# Altium footprint library SparkFun-Retired.PCBLIB: 302 footprints (part 5 of 19)
Each footprint in its own frame and in the unit in brackets; x right, y up, seen from the top. Pads: shape width x height; smd on the part's side, far side on the other; paste and mask are expansions set on the pad; w line width, h text height; cw(c..) or ccw(c..) is an arc to the next point about the centre after c.
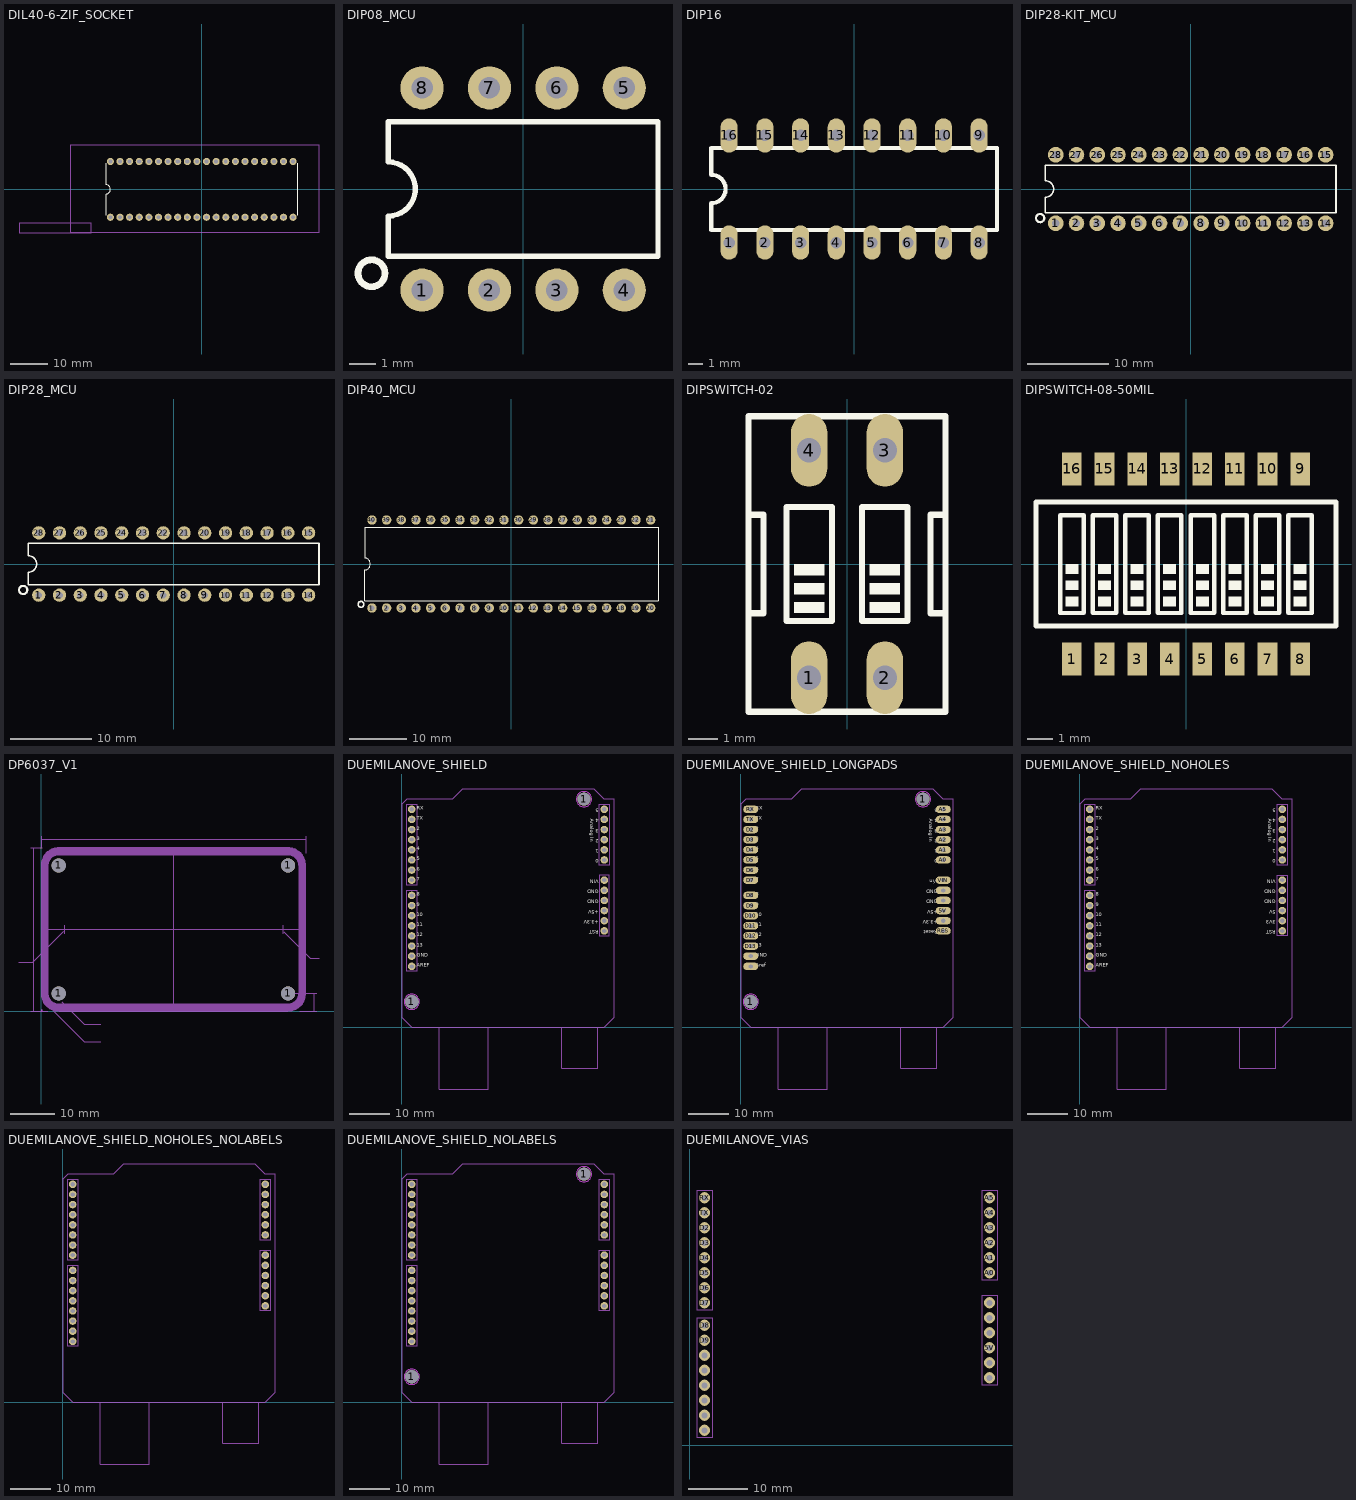
[diagram p4: the footprints below, top view; thin cyan lines are the x and y axes]

## DIL40-6-ZIF_SOCKET [mil]
pads (40):
  round 74 hole 40: 1(-950,-290) 2(-850,-290) 3(-750,-290) 4(-650,-290) 5(-550,-290) 6(-450,-290) 7(-350,-290) 8(-250,-290) 9(-150,-290) 10(-50,-290) 11(50,-290) 12(150,-290) 13(250,-290) 14(350,-290) 15(450,-290) 16(550,-290) 17(650,-290) 18(750,-290) 19(850,-290) 20(950,-290) 21(950,290) 22(850,290) 23(750,290) 24(650,290) 25(550,290) 26(450,290) 27(350,290) 28(250,290)
  round 74 hole 43.31: 29(150,290) 30(50,290) 31(-50,290) 32(-150,290) 33(-250,290) 34(-350,290) 35(-450,290) 36(-550,290) 37(-650,290) 38(-750,290) 39(-850,290) 40(-950,290)
Top Overlay:
  lines w8: -1000,-270 -1000,-50 ccw(c-1000,0) -1000,50 -1000,270 ; 1000,-270 1000,270
Mechanical 16:
  lines w10: -1900,-450 -1900,-350 -1150,-350 -1150,-450 -1900,-450 ; -1368.58,-448.07 1219.21,-448.07 1219.21,457.44 -1368.58,457.44 -1368.58,-448.07

## DIP08_MCU [mil]
pads (8):
  round 64 hole 32: 1(-150,-150) 2(-50,-150) 3(50,-150) 4(150,-150) 5(150,150) 6(50,150) 7(-50,150) 8(-150,150)
Top Overlay:
  circle w10: c-225,-125 r20
  lines w8: -200,-100 200,-100 200,100 -200,100 -200,40 cw(c-200,0) -200,-40 -200,-100

## DIP16 [mil]
pads (16):
  oval 48x96 hole 32: 1(-350,-150) 2(-250,-150) 3(-150,-150) 4(-50,-150) 5(50,-150) 6(150,-150) 7(250,-150) 8(350,-150) 9(350,150) 10(250,150) 11(150,150) 12(50,150) 13(-50,150) 14(-150,150) 15(-250,150) 16(-350,150)
Top Overlay:
  lines w12: -400,-115 400,-115 400,115 -400,115 -400,40 cw(c-400,0) -400,-40 -400,-115

## DIP28-KIT_MCU [mil]
pads (28):
  round 75 hole 34: 1(-650,-165) 2(-550,-165) 3(-450,-165) 4(-350,-165) 5(-250,-165) 6(-150,-165) 7(-50,-165) 8(50,-165) 9(150,-165) 10(250,-165) 11(350,-165) 12(450,-165) 13(550,-165) 14(650,-165) 15(650,165) 16(550,165) 17(450,165) 18(350,165) 19(250,165) 20(150,165) 21(50,165) 22(-50,165) 23(-150,165) 24(-250,165) 25(-350,165) 26(-450,165) 27(-550,165) 28(-650,165)
Top Overlay:
  circle w10: c-725,-140 r20
  lines w8: -700,-115 700,-115 700,115 -700,115 -700,40 cw(c-700,0) -700,-40 -700,-115
Top Solder:
  circle w0: c-650,165 r17
  circle w0: c-550,165 r17
  circle w0: c-450,165 r17
  circle w0: c-350,165 r17
  circle w0: c-650,-165 r17
  circle w0: c-550,-165 r17
  circle w0: c-450,-165 r17
  circle w0: c-350,-165 r17
  circle w0: c-250,165 r17
  circle w0: c-150,165 r17
  circle w0: c-50,165 r17
  circle w0: c50,165 r17
  circle w0: c-250,-165 r17
  circle w0: c-150,-165 r17
  circle w0: c-50,-165 r17
  circle w0: c50,-165 r17
  circle w0: c150,165 r17
  circle w0: c250,165 r17
  circle w0: c350,165 r17
  circle w0: c450,165 r17
  circle w0: c150,-165 r17
  circle w0: c250,-165 r17
  circle w0: c350,-165 r17
  circle w0: c450,-165 r17
  circle w0: c550,165 r17
  circle w0: c650,165 r17
  circle w0: c550,-165 r17
  circle w0: c650,-165 r17
Bottom Solder:
  circle w0: c-650,165 r42
  circle w0: c-550,165 r42
  circle w0: c-450,165 r42
  circle w0: c-350,165 r42
  circle w0: c-650,-165 r42
  circle w0: c-550,-165 r42
  circle w0: c-450,-165 r42
  circle w0: c-350,-165 r42
  circle w0: c-250,165 r42
  circle w0: c-150,165 r42
  circle w0: c-50,165 r42
  circle w0: c50,165 r42
  circle w0: c-250,-165 r42
  circle w0: c-150,-165 r42
  circle w0: c-50,-165 r42
  circle w0: c50,-165 r42
  circle w0: c150,165 r42
  circle w0: c250,165 r42
  circle w0: c350,165 r42
  circle w0: c450,165 r42
  circle w0: c150,-165 r42
  circle w0: c250,-165 r42
  circle w0: c350,-165 r42
  circle w0: c450,-165 r42
  circle w0: c550,165 r42
  circle w0: c650,165 r42
  circle w0: c550,-165 r42
  circle w0: c650,-165 r42

## DIP28_MCU [mil]
pads (28):
  round 64 hole 32: 1(-650,-150) 2(-550,-150) 3(-450,-150) 4(-350,-150) 5(-250,-150) 6(-150,-150) 7(-50,-150) 8(50,-150) 9(150,-150) 10(250,-150) 11(350,-150) 12(450,-150) 13(550,-150) 14(650,-150) 15(650,150) 16(550,150) 17(450,150) 18(350,150) 19(250,150) 20(150,150) 21(50,150) 22(-50,150) 23(-150,150) 24(-250,150) 25(-350,150) 26(-450,150) 27(-550,150) 28(-650,150)
Top Overlay:
  circle w10: c-725,-125 r20
  lines w8: -700,-100 700,-100 700,100 -700,100 -700,40 cw(c-700,0) -700,-40 -700,-100

## DIP40_MCU [mil]
pads (40):
  round 64 hole 32: 1(-950,-300) 2(-850,-300) 3(-750,-300) 4(-650,-300) 5(-550,-300) 6(-450,-300) 7(-350,-300) 8(-250,-300) 9(-150,-300) 10(-50,-300) 11(50,-300) 12(150,-300) 13(250,-300) 14(350,-300) 15(450,-300) 16(550,-300) 17(650,-300) 18(750,-300) 19(850,-300) 20(950,-300) 21(950,300) 22(850,300) 23(750,300) 24(650,300) 25(550,300) 26(450,300) 27(350,300) 28(250,300) 29(150,300) 30(50,300) 31(-50,300) 32(-150,300) 33(-250,300) 34(-350,300) 35(-450,300) 36(-550,300) 37(-650,300) 38(-750,300) 39(-850,300) 40(-950,300)
Top Overlay:
  circle w10: c-1025,-275 r20
  lines w8: -1000,-250 -1000,-40 ccw(c-1000,0) -1000,40 -1000,250 1000,250 1000,-250 -1000,-250

## DIPSWITCH-02 [mil]
pads (4):
  oval 48x96 hole 32: 1(-50,-150) 2(50,-150) 3(50,150) 4(-50,150)
Top Overlay:
  rectangle: 30,-15 70,0
  rectangle: 30,-40 70,-25
  rectangle: 30,-65 70,-50
  rectangle: -70,-15 -30,0
  rectangle: -70,-40 -30,-25
  rectangle: -70,-65 -30,-50
  lines w8: -130,-65 -110,-65 -110,65 -130,65 ; -130,-65 -130,-195 130,-195 130,-65 ; -130,-65 -130,65 ; -130,65 -130,195 130,195 130,65 ; 130,-65 110,-65 110,65 130,65 ; 130,-65 130,65 ; -80,-75 -80,75 -20,75 -20,-75 -80,-75 ; 20,-75 20,75 80,75 80,-75 20,-75
Mechanical 16:
  text "1" at -60,-165 h93
  text "ON" at -100,100 h93
  text "2" at 30,-165 h93

## DIPSWITCH-08-50MIL [mil]
pads (16):
  rect 30x50 smd: 1(-175,-145.67) 2(-125,-145.67) 3(-75,-145.67) 4(-25,-145.67) 5(25,-145.67) 6(75,-145.67) 7(125,-145.67) 8(175,-145.67) 9(175,145.67) 10(125,145.67) 11(75,145.67) 12(25,145.67) 13(-25,145.67) 14(-75,145.67) 15(-125,145.67) 16(-175,145.67)
Top Overlay:
  rectangle: -185,-15 -165,0
  rectangle: -185,-40 -165,-25
  rectangle: -185,-65 -165,-50
  rectangle: -135,-15 -115,0
  rectangle: -135,-40 -115,-25
  rectangle: -135,-65 -115,-50
  rectangle: -85,-15 -65,0
  rectangle: -85,-40 -65,-25
  rectangle: -85,-65 -65,-50
  rectangle: -35,-15 -15,0
  rectangle: -35,-40 -15,-25
  rectangle: -35,-65 -15,-50
  rectangle: 15,-15 35,0
  rectangle: 15,-40 35,-25
  rectangle: 15,-65 35,-50
  rectangle: 65,-15 85,0
  rectangle: 65,-40 85,-25
  rectangle: 65,-65 85,-50
  rectangle: 115,-15 135,0
  rectangle: 115,-40 135,-25
  rectangle: 115,-65 135,-50
  rectangle: 165,-15 185,0
  rectangle: 165,-40 185,-25
  rectangle: 165,-65 185,-50
  lines w6: -193,-75 -157,-75 ; -143,-75 -107,-75 ; -93,-75 -57,-75 ; -43,-75 -7,-75 ; 7,-75 43,-75 ; 57,-75 93,-75 ; 107,-75 143,-75 ; 157,-75 193,-75
  lines w7: -193,-75 -193,75 -157,75 -157,-75 ; -143,-75 -143,75 -107,75 -107,-75 ; -93,-75 -93,75 -57,75 -57,-75 ; -43,-75 -43,75 -7,75 -7,-75 ; 7,-75 7,75 43,75 43,-75 ; 57,-75 57,75 93,75 93,-75 ; 107,-75 107,75 143,75 143,-75 ; 157,-75 157,75 193,75 193,-75
  lines w8: -230,-95 230,-95 230,-65 230,65 230,95 -230,95 -230,65 -230,-65 -230,-95
Mechanical 16:
  text "1" at -190,-165 h62
  text "ON" at -225,50 h49.6
  text "2" at -140,-165 h62
  text "3" at -90,-165 h62
  text "4" at -40,-165 h62
  text "5" at 10,-165 h62
  text "6" at 60,-165 h62
  text "7" at 110,-165 h62
  text "8" at 160,-165 h62

## DP6037_V1 [mm]
pads (4):
  round 3.2 hole 3.2: 1(4,4) 1(4,33) 1(56,4) 1(56,33)
Bottom Overlay:
  text "DP6037_v1" at 52.5,0.5 h1.08
Mechanical 1:
  lines w0: 0,4 ccw(c4,4) 4,0 ; 0,33 cw(c4,33) 4,37 ; 56,0 ccw(c56,4) 60,4 ; 56,37 cw(c56,33) 60,33
  lines w0.203: 0,4 0,33 cw(c4,33) 4,37 56,37 cw(c56,33) 60,33 60,4 cw(c56,4) 56,0 4,0 cw(c4,4) 0,4
Mechanical 8 keep-out:
  region: 0,0 0.254,0 0.254,0.254 0,0.254
  region: 0,0 0.254,0 0.254,0.254 0,0.254
  region: 0,0 0.254,0 0.254,0.254 0,0.254
  region: 0,0 0.254,0 0.254,0.254 0,0.254
Mechanical 9 keep-out:
  region: 0,0 0.254,0 0.254,0.254 0,0.254
  region: 0,0 0.254,0 0.254,0.254 0,0.254
  region: 0,0 0.254,0 0.254,0.254 0,0.254
  region: 0,0 0.254,0 0.254,0.254 0,0.254
Mechanical 10:
  region: 0,0 0.254,0 0.254,0.254 0,0.254
  region: 0,0 0.254,0 0.254,0.254 0,0.254
  region: 0,0 0.254,0 0.254,0.254 0,0.254
  region: 0,0 0.254,0 0.254,0.254 0,0.254
Mechanical 12:
  lines w0.127: -2.305,0 -1.67,0 ; -2.305,37 -1.67,37 ; 0,37.065 0,38.97 ; 0,39.605 0,38.97 ; 0.235,37 -1.67,37 ; 1.505,0 -1.67,0 ; 2.68,0.14 9.76,-6.94 13.57,-6.94 ; 4.68,2.14 9.76,-2.94 13.57,-2.94 ; 56,4 61.83,4 ; 58.655,0 61.83,0 ; 60,35.795 60,38.97 ; 60,39.605 60,38.97 ; 62.465,0 61.83,0 ; 62.465,4 61.83,4 ; -1.67,0 -1.67,37 ; 0,38.97 60,38.97 ; 61.83,0 61.83,4
  text "60mm" at 28.81,38.97 h2.16
  text "37mm" at -1.67,14.205 h2.16
  text "D = 3.2mm" at 13.57,-3.575 h2.16
  text "4.0mm" at 65.64,-1.035 h2.16
  text "R = 4.0mm" at 13.57,-7.575 h2.16
  text "60mm" at 28.81,38.97 h2.16
  text "37mm" at -1.67,14.205 h2.16
  text "D = 3.2mm" at 13.57,-3.575 h2.16
  text "4.0mm" at 65.64,-1.035 h2.16
  text "R = 4.0mm" at 13.57,-7.575 h2.16
Mechanical 14:
  lines w0: -5,11 -2,11 5,18 ; 0,18.5 60,18.5 ; 5.25,17.5 5.25,19.5 ; 30,0 30,37 ; 54.75,17.5 54.75,19.5 ; 55,18 61,12 63,12
  text "CENTER" at -10.38,11 h0.86
  text "CENTER" at -10.38,11 h0.86
  text "CENTER" at 63,12 h0.86
Mechanical 27:
  lines w1.7: 0.85,4 0.85,33 cw(c4,33) 4,36.15 56,36.15 cw(c56,33) 59.15,33 59.15,4 cw(c56,4) 56,0.85 4,0.85 cw(c4,4) 0.85,4
Mechanical 28:
  lines w1.7: 0.85,4 0.85,33 cw(c4,33) 4,36.15 56,36.15 cw(c56,33) 59.15,33 59.15,4 cw(c56,4) 56,0.85 4,0.85 cw(c4,4) 0.85,4

## DUEMILANOVE_SHIELD [mil]
pads (30):
  round 130 hole 130: 1(100,250) 1(1800,2250)
  round 74 hole 40: 3.3V(2000,1050) 5V(2000,1150) A0(2000,1650) A1(2000,1750) A2(2000,1850) A3(2000,1950) A4(2000,2050) A5(2000,2150) AREF(100,600) D2(100,1950) D3(100,1850) D4(100,1750) D5(100,1650) D6(100,1550) D7(100,1450) D8(100,1300) D9(100,1200) D10(100,1100) D11(100,1000) D12(100,900) D13(100,800) GND@0(2000,1250) GND@1(2000,1350) GND@2(100,700) RES(2000,950) RX(100,2150) TX(100,2050) VIN(2000,1450)
Top Overlay:
  text "GND" at 1945.5,1270 h62
  text "GND" at 1945.5,1370 h62
  text "+5V" at 1945.5,1170 h62
  text "RST" at 1945.5,970 h62
  text "VIN" at 1945.5,1470 h62
  text "+3.3V" at 1945.5,1070 h62
  text "0" at 1945.5,1670 h62
  text "1" at 1945.5,1770 h62
  text "2" at 1945.5,1870 h62
  text "3" at 1945.5,1970 h62
  text "4" at 1945.5,2070 h62
  text "5" at 1945.5,2170 h62
  text "Analog In" at 1845.5,2055 h62
  text "GND" at 150,680 h62
  text "13" at 150,780 h62
  text "12" at 150,880 h62
  text "11" at 150,980 h62
  text "AREF" at 150,580 h62
  text "10" at 150,1080 h62
  text "9" at 150,1180 h62
  text "8" at 150,1280 h62
  text "7" at 150,1430 h62
  text "6" at 150,1530 h62
  text "5" at 150,1630 h62
  text "4" at 150,1730 h62
  text "3" at 150,1830 h62
  text "2" at 150,1930 h62
  text "TX" at 150,2030 h62
  text "RX" at 150,2130 h62
Mechanical 8 keep-out:
  circle w5: c100,250 r75
  circle w5: c1800,2250 r75
Mechanical 9 keep-out:
  circle w5: c100,250 r75
  circle w5: c1800,2250 r75
Mechanical 16:
  lines w5: 50,550 150,550 150,1350 50,1350 50,550 ; 50,1400 150,1400 150,2200 50,2200 50,1400 ; 1950,900 2050,900 2050,1500 1950,1500 1950,900 ; 1950,1600 2050,1600 2050,2200 1950,2200 1950,1600
  lines w10: 1582.68,-3.94 1582.68,-405.51 1937.01,-405.51 1937.01,-3.94 ; 374.02,0 100,0 0,100 0,2200 50,2250 500,2250 600,2350 1900,2350 2000,2250 2100,2250 2100,100 2000,0 854.33,0 ; 374.02,0 854.33,0 ; 374.02,0 374.02,-610.24 854.33,-610.24 854.33,0

## DUEMILANOVE_SHIELD_LONGPADS [mil]
pads (30):
  round 130 hole 130: 1(100,250) 1(1800,2250)
  oval 148x74 hole 40: 3.3V(2000,1050) 5V(2000,1150) A0(2000,1650) A1(2000,1750) A2(2000,1850) A3(2000,1950) A4(2000,2050) A5(2000,2150) AREF(100,600) D2(100,1950) D3(100,1850) D4(100,1750) D5(100,1650) D6(100,1550) D7(100,1450) D8(100,1300) D9(100,1200) D10(100,1100) D11(100,1000) D12(100,900) D13(100,800) GND@0(2000,1250) GND@1(2000,1350) GND@2(100,700) RES(2000,950) RX(100,2150) TX(100,2050) VIN(2000,1450)
Top Overlay:
  text "GND" at 1945.5,1270 h62
  text "GND" at 1945.5,1370 h62
  text "+5V" at 1945.5,1170 h62
  text "Reset" at 1945.5,970 h62
  text "Vin" at 1945.5,1470 h62
  text "+3.3V" at 1945.5,1070 h62
  text "0" at 1945.5,1670 h62
  text "1" at 1945.5,1770 h62
  text "2" at 1945.5,1870 h62
  text "3" at 1945.5,1970 h62
  text "4" at 1945.5,2070 h62
  text "5" at 1945.5,2170 h62
  text "Analog In" at 1845.5,2055 h62
  text "GND" at 150,680 h62
  text "13" at 150,780 h62
  text "12" at 150,880 h62
  text "11" at 150,980 h62
  text "Aref" at 150,580 h62
  text "10" at 150,1080 h62
  text "9" at 150,1180 h62
  text "8" at 150,1280 h62
  text "7" at 150,1430 h62
  text "6" at 150,1530 h62
  text "5" at 150,1630 h62
  text "4" at 150,1730 h62
  text "3" at 150,1830 h62
  text "2" at 150,1930 h62
  text "TX" at 150,2030 h62
  text "RX" at 150,2130 h62
Mechanical 8 keep-out:
  circle w5: c100,250 r75
  circle w5: c1800,2250 r75
Mechanical 9 keep-out:
  circle w5: c100,250 r75
  circle w5: c1800,2250 r75
Mechanical 16:
  lines w10: 1582.68,-3.94 1582.68,-405.51 1937.01,-405.51 1937.01,-3.94 ; 374.02,0 100,0 0,100 0,2200 50,2250 500,2250 600,2350 1900,2350 2000,2250 2100,2250 2100,100 2000,0 854.33,0 ; 374.02,0 854.33,0 ; 374.02,0 374.02,-610.24 854.33,-610.24 854.33,0

## DUEMILANOVE_SHIELD_NOHOLES [mil]
pads (28):
  round 74 hole 40: 3.3V(2000,1050) 5V(2000,1150) A0(2000,1650) A1(2000,1750) A2(2000,1850) A3(2000,1950) A4(2000,2050) A5(2000,2150) AREF(100,600) D2(100,1950) D3(100,1850) D4(100,1750) D5(100,1650) D6(100,1550) D7(100,1450) D8(100,1300) D9(100,1200) D10(100,1100) D11(100,1000) D12(100,900) D13(100,800) GND@0(2000,1250) GND@1(2000,1350) GND@2(100,700) RES(2000,950) RX(100,2150) TX(100,2050) VIN(2000,1450)
Top Overlay:
  text "GND" at 1935,1370 h62
  text "5V" at 1935,1170 h62
  text "RST" at 1935,970 h62
  text "VIN" at 1935.5,1470 h62
  text "3V3" at 1935,1070 h62
  text "0" at 1935.5,1670 h62
  text "1" at 1935.5,1770 h62
  text "2" at 1935.5,1870 h62
  text "3" at 1935.5,1970 h62
  text "4" at 1935.5,2070 h62
  text "5" at 1935.5,2170 h62
  text "Analog In" at 1845.5,2055 h62
  text "GND" at 160,680 h62
  text "13" at 160,780 h62
  text "12" at 160,880 h62
  text "11" at 160,980 h62
  text "AREF" at 160,580 h62
  text "10" at 160,1080 h62
  text "9" at 160,1180 h62
  text "8" at 160,1280 h62
  text "7" at 160,1430 h62
  text "6" at 160,1530 h62
  text "5" at 160,1630 h62
  text "4" at 160,1730 h62
  text "3" at 160,1830 h62
  text "2" at 160,1930 h62
  text "TX" at 160,2030 h62
  text "RX" at 160,2130 h62
  text "GND" at 1935,1270 h62
Mechanical 16:
  lines w5: 50,550 150,550 150,1350 50,1350 50,550 ; 50,1400 150,1400 150,2200 50,2200 50,1400 ; 1950,900 2050,900 2050,1500 1950,1500 1950,900 ; 1950,1600 2050,1600 2050,2200 1950,2200 1950,1600
  lines w10: 1582.68,-3.94 1582.68,-405.51 1937.01,-405.51 1937.01,-3.94 ; 374.02,0 100,0 0,100 0,2200 50,2250 500,2250 600,2350 1900,2350 2000,2250 2100,2250 2100,100 2000,0 854.33,0 ; 374.02,0 854.33,0 ; 374.02,0 374.02,-610.24 854.33,-610.24 854.33,0

## DUEMILANOVE_SHIELD_NOHOLES_NOLABELS [mil]
pads (28):
  round 74 hole 40: 3.3V(2000,1050) 5V(2000,1150) A0(2000,1650) A1(2000,1750) A2(2000,1850) A3(2000,1950) A4(2000,2050) A5(2000,2150) AREF(100,600) D2(100,1950) D3(100,1850) D4(100,1750) D5(100,1650) D6(100,1550) D7(100,1450) D8(100,1300) D9(100,1200) D10(100,1100) D11(100,1000) D12(100,900) D13(100,800) GND@0(2000,1250) GND@1(2000,1350) GND@2(100,700) RES(2000,950) RX(100,2150) TX(100,2050) VIN(2000,1450)
Mechanical 16:
  lines w5: 50,550 150,550 150,1350 50,1350 50,550 ; 50,1400 150,1400 150,2200 50,2200 50,1400 ; 1950,900 2050,900 2050,1500 1950,1500 1950,900 ; 1950,1600 2050,1600 2050,2200 1950,2200 1950,1600
  lines w10: 1582.68,-3.94 1582.68,-405.51 1937.01,-405.51 1937.01,-3.94 ; 374.02,0 100,0 0,100 0,2200 50,2250 500,2250 600,2350 1900,2350 2000,2250 2100,2250 2100,100 2000,0 854.33,0 ; 374.02,0 854.33,0 ; 374.02,0 374.02,-610.24 854.33,-610.24 854.33,0
  text "GND" at 1935,1370 h62
  text "5V" at 1935,1170 h62
  text "RST" at 1935,970 h62
  text "VIN" at 1935.5,1470 h62
  text "3V3" at 1935,1070 h62
  text "0" at 1935.5,1670 h62
  text "1" at 1935.5,1770 h62
  text "2" at 1935.5,1870 h62
  text "3" at 1935.5,1970 h62
  text "4" at 1935.5,2070 h62
  text "5" at 1935.5,2170 h62
  text "Analog In" at 1845.5,2055 h62
  text "GND" at 160,680 h62
  text "13" at 160,780 h62
  text "12" at 160,880 h62
  text "11" at 160,980 h62
  text "AREF" at 160,580 h62
  text "10" at 160,1080 h62
  text "9" at 160,1180 h62
  text "8" at 160,1280 h62
  text "7" at 160,1430 h62
  text "6" at 160,1530 h62
  text "5" at 160,1630 h62
  text "4" at 160,1730 h62
  text "3" at 160,1830 h62
  text "2" at 160,1930 h62
  text "TX" at 160,2030 h62
  text "RX" at 160,2130 h62
  text "GND" at 1935,1270 h62

## DUEMILANOVE_SHIELD_NOLABELS [mil]
pads (30):
  round 130 hole 130: 1(100,250) 1(1800,2250)
  round 74 hole 40: 3.3V(2000,1050) 5V(2000,1150) A0(2000,1650) A1(2000,1750) A2(2000,1850) A3(2000,1950) A4(2000,2050) A5(2000,2150) AREF(100,600) D2(100,1950) D3(100,1850) D4(100,1750) D5(100,1650) D6(100,1550) D7(100,1450) D8(100,1300) D9(100,1200) D10(100,1100) D11(100,1000) D12(100,900) D13(100,800) GND@0(2000,1250) GND@1(2000,1350) GND@2(100,700) RES(2000,950) RX(100,2150) TX(100,2050) VIN(2000,1450)
Mechanical 8 keep-out:
  circle w5: c100,250 r75
  circle w5: c1800,2250 r75
Mechanical 9 keep-out:
  circle w5: c100,250 r75
  circle w5: c1800,2250 r75
Mechanical 16:
  lines w5: 50,550 150,550 150,1350 50,1350 50,550 ; 50,1400 150,1400 150,2200 50,2200 50,1400 ; 1950,900 2050,900 2050,1500 1950,1500 1950,900 ; 1950,1600 2050,1600 2050,2200 1950,2200 1950,1600
  lines w10: 1582.68,-3.94 1582.68,-405.51 1937.01,-405.51 1937.01,-3.94 ; 374.02,0 100,0 0,100 0,2200 50,2250 500,2250 600,2350 1900,2350 2000,2250 2100,2250 2100,100 2000,0 854.33,0 ; 374.02,0 854.33,0 ; 374.02,0 374.02,-610.24 854.33,-610.24 854.33,0
  text "GND" at 1940.5,1270 h62
  text "GND" at 1940.5,1370 h62
  text "5V" at 1940.5,1170 h62
  text "RST" at 1940.5,970 h62
  text "VIN" at 1940.5,1470 h62
  text "3.3V" at 1940.5,1070 h62
  text "0" at 1940.5,1670 h62
  text "1" at 1940.5,1770 h62
  text "2" at 1940.5,1870 h62
  text "3" at 1940.5,1970 h62
  text "4" at 1940.5,2070 h62
  text "5" at 1940.5,2170 h62
  text "Analog In" at 1840.5,2055 h62
  text "GND" at 155,680 h62
  text "13" at 155,780 h62
  text "12" at 155,880 h62
  text "11" at 155,980 h62
  text "AREF" at 155,580 h62
  text "10" at 155,1080 h62
  text "9" at 155,1180 h62
  text "8" at 155,1280 h62
  text "7" at 155,1430 h62
  text "6" at 155,1530 h62
  text "5" at 155,1630 h62
  text "4" at 155,1730 h62
  text "3" at 155,1830 h62
  text "2" at 155,1930 h62
  text "TX" at 155,2030 h62
  text "RX" at 155,2130 h62

## DUEMILANOVE_VIAS [mil]
pads (28):
  round 74 hole 40: 3.3V(2000,550) 5V(2000,650) A0(2000,1150) A1(2000,1250) A2(2000,1350) A3(2000,1450) A4(2000,1550) A5(2000,1650) AREF(100,100) D2(100,1450) D3(100,1350) D4(100,1250) D5(100,1150) D6(100,1050) D7(100,950) D8(100,800) D9(100,700) D10(100,600) D11(100,500) D12(100,400) D13(100,300) GND@0(2000,750) GND@1(2000,850) GND@2(100,200) RES(2000,450) RX(100,1650) TX(100,1550) VIN(2000,950)
Mechanical 16:
  lines w5: 50,50 150,50 150,850 50,850 50,50 ; 50,900 150,900 150,1700 50,1700 50,900 ; 1950,400 2050,400 2050,1000 1950,1000 1950,400 ; 1950,1100 2050,1100 2050,1700 1950,1700 1950,1100
  text "GND" at 1958,770 h62
  text "GND" at 1958,870 h62
  text "+5V" at 1958,670 h62
  text "Reset" at 1958,470 h62
  text "Vin" at 1958,970 h62
  text "+3.3V" at 1958,570 h62
  text "0" at 1958,1170 h62
  text "1" at 1958,1270 h62
  text "2" at 1958,1370 h62
  text "3" at 1958,1470 h62
  text "4" at 1958,1570 h62
  text "5" at 1958,1670 h62
  text "Analog In" at 1858,1555 h62
  text "GND" at 150,180 h62
  text "13" at 150,280 h62
  text "12" at 150,380 h62
  text "11" at 150,480 h62
  text "Aref" at 150,80 h62
  text "10" at 150,580 h62
  text "9" at 150,680 h62
  text "8" at 150,780 h62
  text "7" at 150,930 h62
  text "6" at 150,1030 h62
  text "5" at 150,1130 h62
  text "4" at 150,1230 h62
  text "3" at 150,1330 h62
  text "2" at 150,1430 h62
  text "TX" at 150,1530 h62
  text "RX" at 150,1630 h62
  text "PWM" at 268.11,480 h62
  text "PWM" at 268.11,580 h62
  text "PWM" at 268.11,680 h62
  text "PWM" at 268.11,1030 h62
  text "PWM" at 268.11,1130 h62
  text "PWM" at 268.11,1330 h62

## DUMMY [mil]